# Altium footprint library Indruino.PcbLib: 383 footprints (part 23 of 24)
Each footprint in its own frame and in the unit in brackets; x right, y up, seen from the top. Pads: shape width x height; smd on the part's side, far side on the other; paste and mask are expansions set on the pad; w line width, h text height; cw(c..) or ccw(c..) is an arc to the next point about the centre after c.
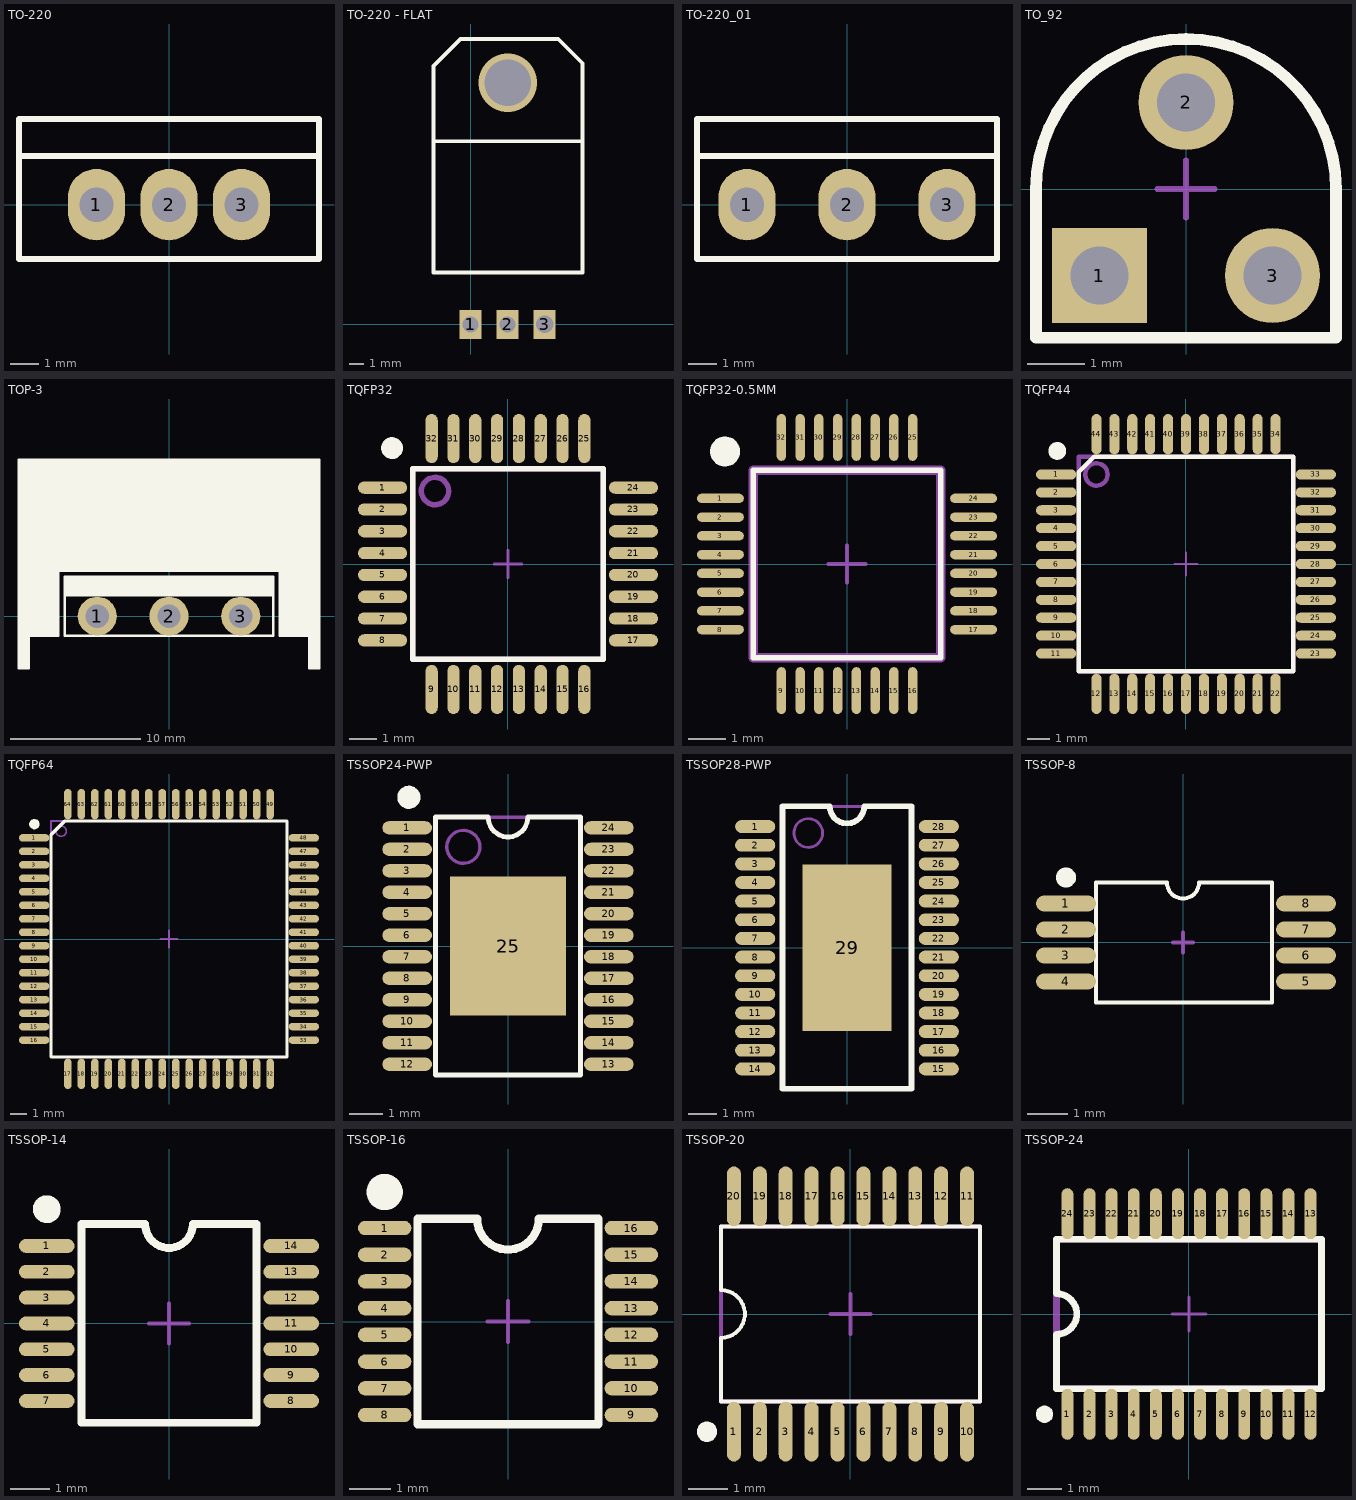
[diagram p22: the footprints below, top view; thin cyan lines are the x and y axes]

## TO-220 [mm]
pads (3):
  oval 2x2.5 hole 1.2: 1(-2.54,0) 2(0,0) 3(2.54,0)
Top Overlay:
  lines w0.2: -5.25,1.7 -5.25,3 5.25,3 5.25,1.7 ; -5.25,1.7 5.25,1.7 ; -5.25,1.7 -5.25,-1.905 5.25,-1.905 5.25,1.7
3D body "User Library-TO-220-3.step": height 8.08, standoff -20.7, extent -4.96,-2.134 4.941,2.366

## TO-220 - FLAT [mm]
pads (3):
  rect 1.5x2 hole 1.1: 1(0,0) 2(2.54,0)
  rect 1.5x2 hole 1.2: 3(5.08,0)
via 2.54,16.562 diameter 4 hole 3.2
Top Overlay:
  lines w0.254: -2.54,5.861 -2.54,17.71 -0.686,19.564 6.007,19.564 7.671,17.901 7.671,3.562 -2.54,3.562 -2.54,12.554 7.671,12.554
3D body "TO220_NAM.step": height 4.45, standoff -1.79, extent -2.54,-0.19 7.62,19.09

## TO-220_01 [mm]
pads (3):
  oval 2x2.5 hole 1.2: 1(-3.5,0) 2(0,0) 3(3.5,0)
Top Overlay:
  lines w0.2: -5.25,1.7 -5.25,-1.905 5.25,-1.905 5.25,1.7 ; -5.25,1.7 5.25,1.7 ; -5.25,1.7 -5.25,3 5.25,3 5.25,1.7
3D body "User Library-TO-220-3.step": height 8.08, standoff -20.7, extent -4.96,-2.134 4.941,2.366

## TO_92 [mm] "SIP with Mounting Hole; 3 Leads; Body 11 x 7.6 x 2.5 mm (typ); Pitch 2.39 mm"
height 13.5
pads (3):
  rect 1.65x1.65 hole 1: 1(-1.5,-1.5)
  round 1.65 hole 1: 2(0,1.5) 3(1.5,-1.5)
Top Overlay:
  lines w0.2: -2.6,-2.579 -2.6,0 cw(c0,0) 2.6,0 2.6,-2.579 -2.6,-2.579
Mechanical 15:
  lines w0.1: -0.5,0 0.5,0 ; 0,-0.5 0,0.5
3D body "User Library-TO-92 Version2.STEP": height 10.7, standoff -3.26, extent -2.8,-2.095 2.79,2.075

## TOP-3 [mm]
pads (3):
  round 3 hole 1.8: 1(-5.5,0) 2(0,0) 3(5.5,0)
Top Overlay:
  rectangle: -8,1.5 8,3
  region: -11.5,-4 -11.5,12 11.5,12 11.5,-4 10.75,-4 10.75,-1.5 8.5,-1.5 8.5,3.5 -8.5,3.5 -8.5,-1.5 -10.75,-1.5 -10.75,-4
  lines w0.2: -10.75,-1.5 -8.5,-1.5 -8.5,3.5 ; -10.75,-1.5 -10.75,-1.5 ; -10.75,-1.5 -10.75,-4 -11.5,-4 -11.5,12 11.5,12 11.5,-4 10.75,-4 10.75,-1.5 ; -8.5,3.5 8.5,3.5 ; -8.5,3.5 -8.5,3.5 ; 8.5,-1.5 10.75,-1.5 ; 8.5,-1.5 8.5,-1.5 ; 8.5,-1.5 8.5,3.5 ; 8.5,3.5 8.5,3.5 ; 10.75,-1.5 10.75,-1.5 ; -8,-1.5 -8,3 8,3 8,-1.5 -8,-1.5
3D body "User Library-TOP3.step": height 10, standoff -25.9, extent -7.75,-1.5 7.75,3

## TQFP32 [mm] "2UFQFPN32, 7 x 7 mm, 32-pin 0.8 mm Pitch"
height 1
pads (32):
  oval 1.8x0.45 smd: 1(-4.6,2.8) 2(-4.6,2) 3(-4.6,1.2) 4(-4.6,0.4) 5(-4.6,-0.4) 6(-4.6,-1.2) 7(-4.6,-2) 8(-4.6,-2.8) 17(4.6,-2.8) 18(4.6,-2) 19(4.6,-1.2) 20(4.6,-0.4) 21(4.6,0.4) 22(4.6,1.2) 23(4.6,2) 24(4.6,2.8)
  oval 0.45x1.8 smd: 9(-2.8,-4.6) 10(-2,-4.6) 11(-1.2,-4.6) 12(-0.4,-4.6) 13(0.4,-4.6) 14(1.2,-4.6) 15(2,-4.6) 16(2.8,-4.6) 25(2.8,4.6) 26(2,4.6) 27(1.2,4.6) 28(0.4,4.6) 29(-0.4,4.6) 30(-1.2,4.6) 31(-2,4.6) 32(-2.8,4.6)
Top Overlay:
  circle w0.2: c-4.25,4.25 r0.3
  region: -4.25,3.95 -4.31,3.95 -4.42,3.996 -4.504,4.08 -4.55,4.19 -4.55,4.25 -4.55,4.31 -4.504,4.42 -4.42,4.504 -4.31,4.55 -4.25,4.55 -4.19,4.55 -4.08,4.504 -3.996,4.42 -3.95,4.31 -3.95,4.25 -3.95,4.19 -3.996,4.08 -4.08,3.996 -4.19,3.95
  lines w0.2: -3.5,-3.5 -3.5,3.5 3.5,3.5 3.5,-3.5 -3.5,-3.5
Mechanical 13:
  circle w0.2: c-2.675,2.675 r0.5
  lines w0.2: -3.5,-3.5 -3.5,3.5 3.5,3.5 3.5,-3.5 -3.5,-3.5
Mechanical 15:
  lines w0.1: -0.5,0 0.5,0 ; 0,-0.5 0,0.5
3D body "atmega8.STEP": height 1.1, standoff -0.01, extent -4.8,-4.8 4.8,4.8

## TQFP32-0.5MM [mm]
pads (32):
  oval 1.25x0.25 smd: 1(-3.375,1.75) 2(-3.375,1.25) 3(-3.375,0.75) 4(-3.375,0.25) 5(-3.375,-0.25) 6(-3.375,-0.75) 7(-3.375,-1.25) 8(-3.375,-1.75) 17(3.375,-1.75) 18(3.375,-1.25) 19(3.375,-0.75) 20(3.375,-0.25) 21(3.375,0.25) 22(3.375,0.75) 23(3.375,1.25) 24(3.375,1.75)
  oval 0.25x1.25 smd: 9(-1.75,-3.375) 10(-1.25,-3.375) 11(-0.75,-3.375) 12(-0.25,-3.375) 13(0.25,-3.375) 14(0.75,-3.375) 15(1.25,-3.375) 16(1.75,-3.375) 25(1.75,3.375) 26(1.25,3.375) 27(0.75,3.375) 28(0.25,3.375) 29(-0.25,3.375) 30(-0.75,3.375) 31(-1.25,3.375) 32(-1.75,3.375)
Top Overlay:
  circle w0.2: c-3.25,3 r0.3
  region: -3.25,2.7 -3.31,2.7 -3.42,2.746 -3.504,2.83 -3.55,2.94 -3.55,3 -3.55,3.06 -3.504,3.17 -3.42,3.254 -3.31,3.3 -3.25,3.3 -3.19,3.3 -3.08,3.254 -2.996,3.17 -2.95,3.06 -2.95,3 -2.95,2.94 -2.996,2.83 -3.08,2.746 -3.19,2.7
  lines w0.15: -2.5,-2.5 2.5,-2.5 2.5,2.5 -2.5,2.5 -2.5,-2.5
Mechanical 4:
  lines w0.254: -2.5,-2.5 2.5,-2.5 ; -2.5,-2.5 -2.5,2.5 ; -2.5,-2.5 2.5,-2.5 ; -2.5,-2.5 -2.5,2.5 ; -2.5,2.5 2.5,2.5 ; -2.5,2.5 2.5,2.5 ; 2.5,-2.5 2.5,2.5 ; 2.5,-2.5 2.5,2.5
Mechanical 15:
  lines w0.1: -0.5,0 0.5,0 ; 0,-0.5 0,0.5
3D body "User Library-TQFP32-5.STEP": height 1.21, standoff -0.03, extent -3.5,-3.495 3.5,3.505

## TQFP44 [mm]
height 1
pads (44):
  oval 1.8x0.45 smd: 1(-5.8,4) 2(-5.8,3.2) 3(-5.8,2.4) 4(-5.8,1.6) 5(-5.8,0.8) 6(-5.8,0) 7(-5.8,-0.8) 8(-5.8,-1.6) 9(-5.8,-2.4) 10(-5.8,-3.2) 11(-5.8,-4) 23(5.8,-4) 24(5.8,-3.2) 25(5.8,-2.4) 26(5.8,-1.6) 27(5.8,-0.8) 28(5.8,0) 29(5.8,0.8) 30(5.8,1.6) 31(5.8,2.4) 32(5.8,3.2) 33(5.8,4)
  oval 0.45x1.8 smd: 12(-4,-5.8) 13(-3.2,-5.8) 14(-2.4,-5.8) 15(-1.6,-5.8) 16(-0.8,-5.8) 17(0,-5.8) 18(0.8,-5.8) 19(1.6,-5.8) 20(2.4,-5.8) 21(3.2,-5.8) 22(4,-5.8) 34(4,5.8) 35(3.2,5.8) 36(2.4,5.8) 37(1.6,5.8) 38(0.8,5.8) 39(0,5.8) 40(-0.8,5.8) 41(-1.6,5.8) 42(-2.4,5.8) 43(-3.2,5.8) 44(-4,5.8)
Top Overlay:
  circle w0.2: c-5.75,5.05 r0.3
  region: -5.75,4.75 -5.81,4.75 -5.92,4.796 -6.004,4.88 -6.05,4.99 -6.05,5.05 -6.05,5.11 -6.004,5.22 -5.92,5.304 -5.81,5.35 -5.75,5.35 -5.69,5.35 -5.58,5.304 -5.496,5.22 -5.45,5.11 -5.45,5.05 -5.45,4.99 -5.496,4.88 -5.58,4.796 -5.69,4.75
  lines w0.2: -4.8,-4.8 4.8,-4.8 4.8,4.8 -4.1,4.8 -4.8,4.1 -4.8,-4.8
Mechanical 13:
  circle w0.2: c-4,4 r0.5
  lines w0.2: -4.8,-4.8 4.8,-4.8 4.8,4.8 -4.8,4.8 -4.8,-4.8
Mechanical 15:
  lines w0.1: -0.5,0 0.5,0 ; 0,-0.5 0,0.5
3D body "User Library-TQFP44-1.step": height 1.1, standoff 0, extent -6.009,-6.009 6.009,6.009

## TQFP64 [mm]
pads (64):
  oval 1.8x0.45 smd: 1(-8,6) 2(-8,5.2) 3(-8,4.4) 4(-8,3.6) 5(-8,2.8) 6(-8,2) 7(-8,1.2) 8(-8,0.4) 9(-8,-0.4) 10(-8,-1.2) 11(-8,-2) 12(-8,-2.8) 13(-8,-3.6) 14(-8,-4.4) 15(-8,-5.2) 16(-8,-6) 33(8,-6) 34(8,-5.2) 35(8,-4.4) 36(8,-3.6) 37(8,-2.8) 38(8,-2) 39(8,-1.2) 40(8,-0.4) 41(8,0.4) 42(8,1.2) 43(8,2) 44(8,2.8) 45(8,3.6) 46(8,4.4) 47(8,5.2) 48(8,6)
  oval 0.45x1.8 smd: 17(-6,-8) 18(-5.2,-8) 19(-4.4,-8) 20(-3.6,-8) 21(-2.8,-8) 22(-2,-8) 23(-1.2,-8) 24(-0.4,-8) 25(0.4,-8) 26(1.2,-8) 27(2,-8) 28(2.8,-8) 29(3.6,-8) 30(4.4,-8) 31(5.2,-8) 32(6,-8) 49(6,8) 50(5.2,8) 51(4.4,8) 52(3.6,8) 53(2.8,8) 54(2,8) 55(1.2,8) 56(0.4,8) 57(-0.4,8) 58(-1.2,8) 59(-2,8) 60(-2.8,8) 61(-3.6,8) 62(-4.4,8) 63(-5.2,8) 64(-6,8)
Top Overlay:
  region: -7.988,6.512 -8.048,6.512 -8.158,6.558 -8.242,6.642 -8.288,6.752 -8.288,6.812 -8.288,6.872 -8.242,6.982 -8.158,7.066 -8.048,7.112 -7.988,7.112 -7.928,7.112 -7.818,7.066 -7.734,6.982 -7.688,6.872 -7.688,6.812 -7.688,6.752 -7.734,6.642 -7.818,6.558 -7.928,6.512
  lines w0.2: -7,-7 -7,6.2 -6.2,7 7,7 7,-7 -7,-7
Mechanical 13:
  circle w0.1: c-6.4,6.4 r0.304
  lines w0.1: -7,-7 7,-7 7,7 -7,7 -7,-7
Mechanical 15:
  lines w0.1: -0.5,0 0.5,0 ; 0,-0.5 0,0.5
3D body "User Library-TQFP64-1.step": height 1.4, standoff 0.04, extent -8.124,-8.124 8.125,8.125

## TSSOP24-PWP [mm]
height 1.2
pads (25):
  oval 1.5x0.4 smd: 1(-3.05,3.575) 2(-3.05,2.925) 3(-3.05,2.275) 4(-3.05,1.625) 5(-3.05,0.975) 6(-3.05,0.325) 7(-3.05,-0.325) 8(-3.05,-0.975) 9(-3.05,-1.625) 10(-3.05,-2.275) 11(-3.05,-2.925) 12(-3.05,-3.575) 13(3.05,-3.575) 14(3.05,-2.925) 15(3.05,-2.275) 16(3.05,-1.625) 17(3.05,-0.975) 18(3.05,-0.325) 19(3.05,0.325) 20(3.05,0.975) 21(3.05,1.625) 22(3.05,2.275) 23(3.05,2.925) 24(3.05,3.575)
  rect 3.5x4.2 smd: 25(0,0)
Top Overlay:
  circle w0.2: c-3,4.5 r0.25
  region: -3,4.25 -3.05,4.25 -3.142,4.288 -3.212,4.358 -3.25,4.45 -3.25,4.5 -3.25,4.55 -3.212,4.642 -3.142,4.712 -3.05,4.75 -3,4.75 -2.95,4.75 -2.858,4.712 -2.788,4.642 -2.75,4.55 -2.75,4.5 -2.75,4.45 -2.788,4.358 -2.858,4.288 -2.95,4.25
  lines w0.15: -2.2,-3.9 2.2,-3.9 2.2,3.9 0.6,3.9 cw(c0,3.9) -0.6,3.9 -2.2,3.9 -2.2,-3.9
Mechanical 13:
  circle w0.1: c-1.35,3 r0.5
  lines w0.1: -2.2,-3.9 -2.2,3.9 2.2,3.9 2.2,-3.9 -2.2,-3.9
Mechanical 15:
  lines w0.1: -0.5,0 0.5,0 ; 0,-0.5 0,0.5
3D body "User Library-TSSOP-24.STEP": height 1.2, standoff 0, extent -3.2,-3.9 3.2,3.9

## TSSOP28-PWP [mm]
height 1.2
pads (29):
  oval 1.4x0.45 smd: 1(-3.2,4.225) 2(-3.2,3.575) 3(-3.2,2.925) 4(-3.2,2.275) 5(-3.2,1.625) 6(-3.2,0.975) 7(-3.2,0.325) 8(-3.2,-0.325) 9(-3.2,-0.975) 10(-3.2,-1.625) 11(-3.2,-2.275) 12(-3.2,-2.925) 13(-3.2,-3.575) 14(-3.2,-4.225) 15(3.2,-4.225) 16(3.2,-3.575) 17(3.2,-2.925) 18(3.2,-2.275) 19(3.2,-1.625) 20(3.2,-0.975) 21(3.2,-0.325) 22(3.2,0.325) 23(3.2,0.975) 24(3.2,1.625) 25(3.2,2.275) 26(3.2,2.925) 27(3.2,3.575) 28(3.2,4.225)
  rect 3.1x5.8 smd: 29(0,0)
Top Overlay:
  lines w0.2: -2.25,-4.92 2.25,-4.92 2.25,4.935 0.6,4.935 cw(c0,4.935) -0.6,4.935 -2.25,4.935 -2.25,-4.92
Mechanical 13:
  circle w0.1: c-1.35,4 r0.5
  lines w0.1: -2.25,-4.905 2.25,-4.905 2.25,4.925 -2.25,4.925 -2.25,-4.905
Mechanical 15:
  lines w0.1: -0.5,0 0.5,0 ; 0,-0.5 0,0.5
3D body "User Library-PWP (R-PDSO-G28).STEP": height 1.2, standoff 0, extent -3.315,-4.885 3.305,4.915

## TSSOP-8 [mm]
pads (8):
  oval 1.5x0.4 smd: 1(-2.925,0.975) 2(-2.925,0.325) 3(-2.925,-0.325) 4(-2.925,-0.975) 5(3.075,-0.975) 6(3.075,-0.325) 7(3.075,0.325) 8(3.075,0.975)
Top Overlay:
  circle w0.3: c-2.925,1.625 r0.1
  lines w0.1: -2.175,-1.5 2.225,-1.5 2.225,1.5 0.4,1.5 cw(c0,1.5) -0.4,1.5 -2.175,1.5 -2.175,-1.5
Mechanical 15:
  lines w0.1: -0.25,0 0.25,0 ; 0,-0.25 0,0.25
3D body "User Library-TSSOP-8.STEP": height 1.06, standoff -0.14, extent -3.175,-1.5 3.225,1.5

## TSSOP-14 [mm] "TSOP14-Leads, Body 6.5x4.4mm, Pitch 0.65mm, IPC Medium Density"
height 1.2
pads (14):
  oval 1.4x0.35 smd: 1(-3.075,1.95) 2(-3.075,1.3) 3(-3.075,0.65) 4(-3.075,0) 5(-3.075,-0.65) 6(-3.075,-1.3) 7(-3.075,-1.95) 8(3.075,-1.95) 9(3.075,-1.3) 10(3.075,-0.65) 11(3.075,0) 12(3.075,0.65) 13(3.075,1.3) 14(3.075,1.95)
Top Overlay:
  circle w0.2: c-3.075,2.875 r0.25
  region: -3.075,2.625 -3.125,2.625 -3.217,2.663 -3.287,2.733 -3.325,2.825 -3.325,2.875 -3.325,2.925 -3.287,3.017 -3.217,3.087 -3.125,3.125 -3.075,3.125 -3.025,3.125 -2.933,3.087 -2.863,3.017 -2.825,2.925 -2.825,2.875 -2.825,2.825 -2.863,2.733 -2.933,2.663 -3.025,2.625
  lines w0.2: -0.625,2.5 -2.2,2.5 -2.2,-2.5 2.2,-2.5 2.2,2.5 0.625,2.5 ; -0.6,2.5 ccw(c0,2.5) 0.6,2.5
Mechanical 15:
  lines w0.1: -0.5,0 0.5,0 ; 0,-0.5 0,0.5
3D body "SW3dPS-TSSOP14-1.STEP": height 1.1, standoff 0, extent -3.22,-2.505 3.18,2.495

## TSSOP-16 [mm] "TSOP14-Leads, Body 6.5x4.4mm, Pitch 0.65mm, IPC Medium Density"
height 1.2
pads (16):
  oval 1.3x0.35 smd: 1(-3,2.275) 2(-3,1.625) 3(-3,0.975) 4(-3,0.325) 5(-3,-0.325) 6(-3,-0.975) 7(-3,-1.625) 8(-3,-2.275) 9(3,-2.275) 10(3,-1.625) 11(3,-0.975) 12(3,-0.325) 13(3,0.325) 14(3,0.975) 15(3,1.625) 16(3,2.275)
Top Overlay:
  circle w0.6: c-3,3.15 r0.14
  lines w0.2: -2.2,-2.5 -2.2,2.5 -0.75,2.5 ccw(c0,2.5) 0.75,2.5 2.2,2.5 2.2,-2.5 -2.2,-2.5
Mechanical 15:
  lines w0.1: -0.5,0 0.5,0 ; 0,-0.5 0,0.5
3D body "SW3dPS-TSSOP-16.STEP": height 1, standoff 0, extent -3.2,-2.5 3.2,2.5

## TSSOP-20 [mm]
pads (20):
  oval 0.35x1.5 smd: 1(-2.925,-2.95) 2(-2.275,-2.95) 3(-1.625,-2.95) 4(-0.975,-2.95) 5(-0.325,-2.95) 6(0.325,-2.95) 7(0.975,-2.95) 8(1.625,-2.95) 9(2.275,-2.95) 10(2.925,-2.95) 11(2.925,2.95) 12(2.275,2.95) 13(1.625,2.95) 14(0.975,2.95) 15(0.325,2.95) 16(-0.325,2.95) 17(-0.975,2.95) 18(-1.625,2.95) 19(-2.275,2.95) 20(-2.925,2.95)
Top Overlay:
  region: -3.6,-3.2 -3.65,-3.2 -3.742,-3.162 -3.812,-3.092 -3.85,-3 -3.85,-2.95 -3.85,-2.9 -3.812,-2.808 -3.742,-2.738 -3.65,-2.7 -3.6,-2.7 -3.55,-2.7 -3.458,-2.738 -3.388,-2.808 -3.35,-2.9 -3.35,-2.95 -3.35,-3 -3.388,-3.092 -3.458,-3.162 -3.55,-3.2
  lines w0.1: -3.25,-2.2 -3.25,-0.6 ccw(c-3.25,0) -3.25,0.6 -3.25,2.2 3.25,2.2 3.25,-2.2 -3.25,-2.2
Mechanical 13:
  lines w0.1: -3.25,-2.2 3.25,-2.2 3.25,2.2 -3.25,2.2 -3.25,-2.2
Mechanical 15:
  lines w0.1: -0.5,0 0.5,0 ; 0,-0.5 0,0.5
3D body "SW3dPS-TSSOP20.STEP": height 1.09, standoff 0, extent -3.155,-3.172 3.345,3.108

## TSSOP-24 [mm]
pads (24):
  oval 0.35x1.5 smd: 1(-3.575,-2.95) 2(-2.925,-2.95) 3(-2.275,-2.95) 4(-1.625,-2.95) 5(-0.975,-2.95) 6(-0.325,-2.95) 7(0.325,-2.95) 8(0.975,-2.95) 9(1.625,-2.95) 10(2.275,-2.95) 11(2.925,-2.95) 12(3.575,-2.95) 13(3.575,2.95) 14(2.925,2.95) 15(2.275,2.95) 16(1.625,2.95) 17(0.975,2.95) 18(0.325,2.95) 19(-0.325,2.95) 20(-0.975,2.95) 21(-1.625,2.95) 22(-2.275,2.95) 23(-2.925,2.95) 24(-3.575,2.95)
Top Overlay:
  region: -4.25,-3.2 -4.3,-3.2 -4.392,-3.162 -4.462,-3.092 -4.5,-3 -4.5,-2.95 -4.5,-2.9 -4.462,-2.808 -4.392,-2.738 -4.3,-2.7 -4.25,-2.7 -4.2,-2.7 -4.108,-2.738 -4.038,-2.808 -4,-2.9 -4,-2.95 -4,-3 -4.038,-3.092 -4.108,-3.162 -4.2,-3.2
  lines w0.2: -3.9,-2.2 3.9,-2.2 3.9,2.2 -3.9,2.2 -3.9,0.6 cw(c-3.9,0) -3.9,-0.6 -3.9,-2.2
Mechanical 13:
  lines w0.2: -3.9,-2.2 -3.9,2.2 3.9,2.2 3.9,-2.2 -3.9,-2.2
  text "'.Designator'" at -3.175,-0.525 h1.2
Mechanical 15:
  lines w0.1: -0.5,0 0.5,0 ; 0,-0.5 0,0.5
3D body "User Library-TSSOP-24.STEP": height 1.2, standoff 0, extent -3.9,-3.2 3.9,3.2